# Altium footprint library PCBLIB.PcbLib: 103 footprints (part 5 of 7)
Each footprint in its own frame and in the unit in brackets; x right, y up, seen from the top. Pads: shape width x height; smd on the part's side, far side on the other; paste and mask are expansions set on the pad; w line width, h text height; cw(c..) or ccw(c..) is an arc to the next point about the centre after c.
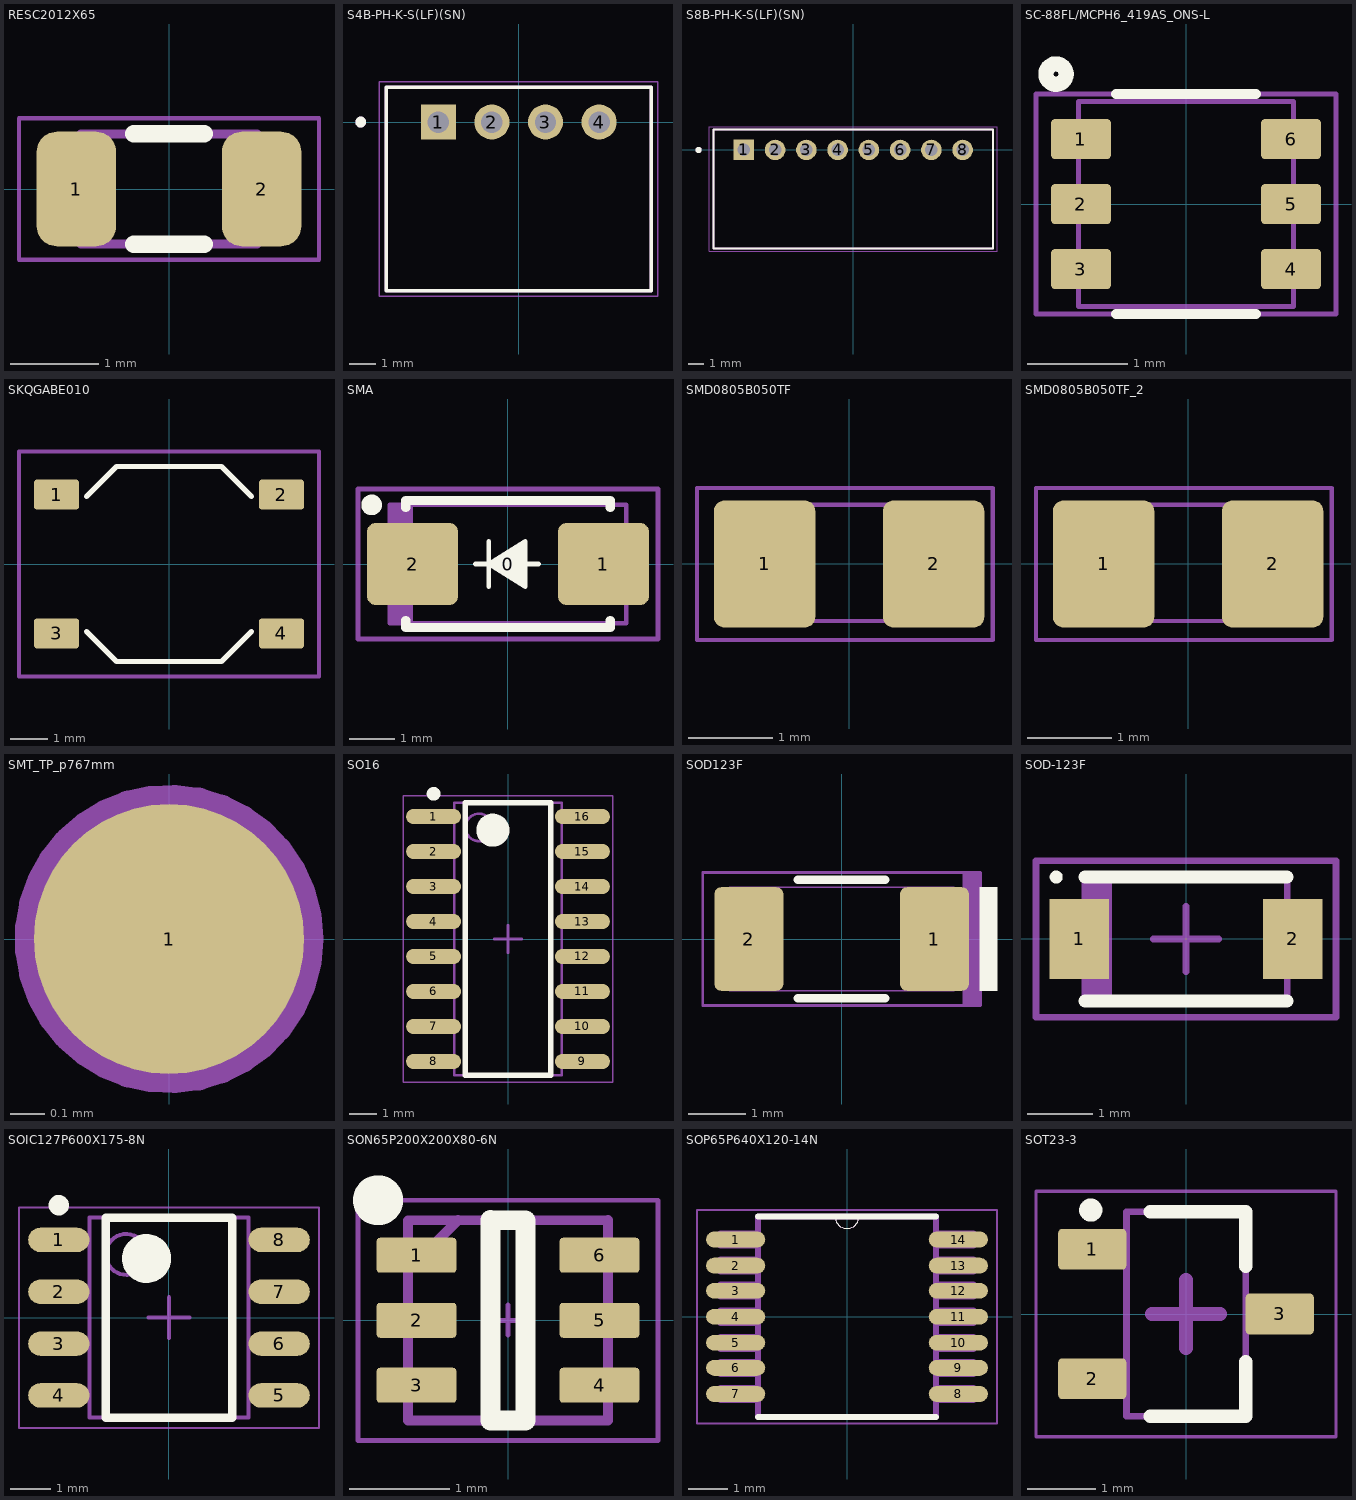
[diagram p4: the footprints below, top view; thin cyan lines are the x and y axes]

## RESC2012X65 [mm]
pads (2):
  rrect50% 0.9x1.3 smd paste+0 mask+0.05: 1(-1.05,0) 2(1.05,0)
Top Overlay:
  lines w0.2: -0.4,-0.625 0.4,-0.625 ; -0.4,0.625 0.4,0.625
Top Component Outline:
  lines w0.05: -1.7,-0.8 1.7,-0.8 1.7,0.8 -1.7,0.8 -1.7,-0.8
Top Assembly:
  region: 0.7,-0.625 0.7,0.625 1,0.625 1,-0.625
  region: -1,-0.625 -1,0.625 -0.7,0.625 -0.7,-0.625
  lines w0.1: -0.7,-0.525 -0.7,0.525 ; 0.7,-0.525 0.7,0.525 ; -0.7,-0.625 0.7,-0.625 ; -0.7,-0.625 -0.7,0.625 ; -0.7,-0.625 -0.72,-0.625 -0.74,-0.625 -1,-0.625 -1,0.625 -0.74,0.625 -0.72,0.625 -0.7,0.625 ; -0.7,0.625 0.7,0.625 ; 0.7,-0.625 0.7,0.625 ; 0.7,-0.625 0.72,-0.625 0.74,-0.625 1,-0.625 1,0.625 0.74,0.625 0.72,0.625 0.7,0.625
Top Designator:
  text ".Designator" at 1.578,0.158 h0.7
Bottom Designator:
  text ".Comment" at -0.506,-0.2 h0.64
Mechanical 11:
  text ".Designator" at -0.506,-0.2 h0.64
3D body "RES0805.step": height 0.5, standoff 0, extent -1,-0.625 1,0.625

## S4B-PH-K-S(LF)(SN) [mm]
pads (4):
  rect 1.308x1.308 / inner round 1.308 / far side rect 1.308x1.308 hole 0.8: 1(-3,0)
  round 1.308 hole 0.8: 2(-1,0) 3(1,0) 4(3,0)
Top Overlay:
  circle w0.2: c-5.9,0 r0.1
  lines w0.127: -4.95,-6.3 4.95,-6.3 4.95,1.3 -4.95,1.3 -4.95,-6.3
Bottom Courtyard:
  circle w0.2: c-5.9,0 r0.1
  lines w0.127: -4.95,-6.3 -4.95,1.3 4.95,1.3 4.95,-6.3 -4.95,-6.3
Bottom 3D Body:
  lines w0.05: -5.2,-6.5 5.2,-6.5 5.2,1.5 -5.2,1.5 -5.2,-6.5
3D body "JST-S4B-PH-K-S.STEP": height 4.8, standoff -3.4, extent -4.95,-6.3 4.95,1.3

## S8B-PH-K-S(LF)(SN) [mm]
pads (8):
  rect 1.308x1.308 / inner round 1.308 / far side rect 1.308x1.308 hole 0.8: 1(-7,0)
  round 1.308 hole 0.8: 2(-5,0) 3(-3,0) 4(-1,0) 5(1,0) 6(3,0) 7(5,0) 8(7,0)
Top Overlay:
  circle w0.2: c-9.9,0 r0.1
  lines w0.127: -8.95,-6.3 -8.95,1.3 8.95,1.3 8.95,-6.3 -8.95,-6.3
Bottom Courtyard:
  circle w0.2: c-9.9,0 r0.1
  lines w0.127: -8.95,-6.3 8.95,-6.3 8.95,1.3 -8.95,1.3 -8.95,-6.3
Bottom 3D Body:
  lines w0.05: -9.2,-6.5 -9.2,1.5 9.2,1.5 9.2,-6.5 -9.2,-6.5
3D body "JST-S8B-PH-K-S.STEP": height 4.8, standoff -3.4, extent -8.95,-6.3 8.95,1.3

## SC-88FL/MCPH6_419AS_ONS-L [mm]
pads (6):
  rrect20% 0.6x0.4 smd paste+0 mask+0.05: 1(-1.05,0.65) 2(-1.05,0) 3(-1.05,-0.65) 4(1.05,-0.65) 5(1.05,0) 6(1.05,0.65)
Top Overlay:
  circle w0.152: c-1.3,1.3 r0.102
  lines w0.1: -0.7,-1.1 0.7,-1.1 ; -0.7,1.1 0.7,1.1
Top Component Outline:
  lines w0.05: -1.5,-1.1 1.5,-1.1 1.5,1.1 -1.5,1.1 -1.5,-1.1
Top Assembly:
  lines w0.05: -1.075,-1.025 1.075,-1.025 1.075,1.025 -1.075,1.025 -1.075,-1.025
Top Designator:
  text ".Designator" at -0.915,-0.115 h0.4
3D body "SC-88FLMCPH6_419AS_ONS.step": height 0.89, standoff 0, extent -1.08,-1.029 1.08,1.029

## SKQGABE010 [mm]
pads (4):
  rrect20% 1.2x0.8 smd mask+0.102: 1(-3,1.85) 2(3,1.85) 3(-3,-1.85) 4(3,-1.85)
Top Overlay:
  lines w0.127: -2.2,-1.8 -1.4,-2.6 1.4,-2.6 2.2,-1.8 ; -2.2,1.8 -1.4,2.6 1.4,2.6 2.2,1.8
Top Component Outline:
  lines w0.1: -4,-3 -4,3 4,3 4,-3 -4,-3
3D body "skqgabe010.stp": height 1.5, standoff 0, extent -3.2,-2.6 3.2,2.6

## SMA [mm]
pads (3):
  round 0.508 on Mech7 mask+0.07: 0(0,0)
  rrect20% 2x1.8 smd mask+0.07: 1(2.1,0) 2(-2.1,0)
Top Overlay:
  circle w0.254: c-3,1.3 r0.1
  region: 0.375,-0.5 0.375,0.5 -0.425,0
  lines w0.1: -0.725,0 -0.425,0 ; -0.425,-0.5 -0.425,0 ; -0.425,0.5 -0.425,0 ; 0.375,0 0.675,0 ; -0.425,0 0.375,-0.5 0.375,0.5 -0.425,0
  lines w0.2: -2.25,-1.24 -2.25,-1.4 2.25,-1.4 2.25,-1.24 ; -2.25,1.24 -2.25,1.4 2.25,1.4 2.25,1.24
Top Component Outline:
  lines w0.1: -3.3,-1.65 3.3,-1.65 3.3,1.65 -3.3,1.65 -3.3,-1.65
Top Assembly:
  region: -2.6,1.3 -2.1,1.3 -2.1,-1.3 -2.6,-1.3
  lines w0.1: -2.6,-1.3 -2.6,1.3 2.6,1.3 2.6,-1.3 -2.6,-1.3
Top Designator:
  text ".Value" at 1.019,0.249 h0.8
3D body "SW3dPS-DO-214AC SMA.STEP": height 2.42, standoff 0.02, extent -2.6,-1.3 2.6,1.3

## SMD0805B050TF [mm] "PPTC SMD 0805, 6V 0.5A, REEL 7\""
height 0.6
pads (2):
  rrect20% 1.2x1.5 smd paste+0 mask+0.05: 1(-1,0) 2(1,0)
Top Component Outline:
  lines w0.05: -1.8,-0.9 1.7,-0.9 1.7,0.9 -1.8,0.9 -1.8,-0.9
Top Assembly:
  lines w0.05: -1.2,-0.675 -1.2,0.7 1.075,0.7 1.075,-0.675 -1.2,-0.675
Top Designator:
  text ".Designator" at 0.897,0.09 h0.4
Bottom Designator:
  text ".Designator" at -1.025,0 h0.5
3D body "User Library-Part1-227.STEP": height 0.86, standoff -0.01, extent -1.15,-0.75 1.15,0.75

## SMD0805B050TF_2 [mm]
pads (2):
  rrect20% 1.2x1.5 smd paste+0 mask+0.05: 1(-1,0) 2(1,0)
Top Component Outline:
  lines w0.05: -1.8,-0.9 -1.8,0.9 1.7,0.9 1.7,-0.9 -1.8,-0.9
Top Assembly:
  lines w0.05: -1.2,-0.675 1.075,-0.675 1.075,0.7 -1.2,0.7 -1.2,-0.675
Top Designator:
  text ".Designator" at 0.897,0.09 h0.4
Bottom Designator:
  text ".Designator" at -1.025,0 h0.5
3D body "User Library-Part1-227.STEP": height 0.86, standoff -0.01, extent -1.15,-0.75 1.15,0.75

## SMT_TP_p767mm [mm] "Test Point"
pads (1):
  round 0.787 smd paste-5 mask+0.05: 1(0,0)
Top Component Center:
  circle w0.015: c0,0 r0.416
  lines w0.05: -0.2,0 0.2,0 ; 0,-0.2 0,0.2
Bottom Component Center:
  circle w0.1: c0,0 r0.4
Top Assembly:
  text ".Designator" at -0.897,-0.09 h0.4
Mechanical 17:
  circle w0.015: c0,0 r0.437
3D body: height 0.05, standoff 0, extent -0.425,-0.425 0.422,0.425

## SO16 [mm] "SOIC, 16-Leads, Body 9.90x3.91mm, Pitch 1.27mm, IPC Medium Density"
height 1.75
pads (16):
  oval 2x0.55 smd: 1(-2.7,4.445) 2(-2.7,3.175) 3(-2.7,1.905) 4(-2.7,0.635) 5(-2.7,-0.635) 6(-2.7,-1.905) 7(-2.7,-3.175) 8(-2.7,-4.445) 9(2.7,-4.445) 10(2.7,-3.175) 11(2.7,-1.905) 12(2.7,-0.635) 13(2.7,0.635) 14(2.7,1.905) 15(2.7,3.175) 16(2.7,4.445)
Top Overlay:
  circle w0.6: c-0.55,3.95 r0.3
  circle w0.25: c-2.7,5.27 r0.125
  lines w0.2: -1.55,-4.95 1.55,-4.95 1.55,4.95 -1.55,4.95 -1.55,-4.95
Top Component Outline:
  lines w0.05: -3.81,-5.2 3.81,-5.2 3.81,5.2 -3.81,5.2 -3.81,-5.2
Bottom Courtyard:
  circle w0.1: c-1.05,4.05 r0.5
  lines w0.1: -1.95,-4.95 1.95,-4.95 1.95,4.95 -1.95,4.95 -1.95,-4.95
Bottom 3D Body:
  lines w0.1: -0.5,0 0.5,0 ; 0,-0.5 0,0.5
3D body "User Library-SOIC-16-1.step": height 1.4, standoff 0, extent -3,-4.95 3,4.95

## SOD123F [mm]
pads (2):
  rrect20% 1.2x1.8 smd paste+0 mask+0.05: 1(1.613,0) 2(-1.613,0)
Top Overlay:
  region: 2.4,0.9 2.4,-0.9 2.7,-0.9 2.7,0.9
  lines w0.152: -0.759,-1.029 0.759,-1.029 ; -0.759,1.029 0.759,1.029
Top Component Outline:
  lines w0.05: -2.413,-1.156 -2.413,1.156 2.413,1.156 2.413,-1.156 -2.413,-1.156
Bottom Courtyard:
  lines w0.025: -1.549,-0.451 -1.099,-0.902 ; -1.549,0.451 -1.099,0.902 ; -1.549,-0.902 -1.549,0.902 ; -1.549,-0.902 1.549,-0.902 ; -1.549,-0.902 -1.956,-0.902 -1.956,0.902 -1.549,0.902 ; -1.549,-0.902 -1.549,0.902 ; -1.549,0.902 1.549,0.902 ; 1.549,-0.902 1.549,0.902 ; 1.549,-0.902 1.956,-0.902 1.956,0.902 1.549,0.902 ; 1.549,-0.902 1.549,0.902
Bottom 3D Body:
  region: 2.413,1.156 2.108,1.156 2.108,-1.156 2.413,-1.156
3D body "CDBM.step": height 0.82, standoff 0, extent -1.956,-0.902 1.956,0.902

## SOD-123F [mm] "Molded Diode, 2-Leads, Body 2.83x1.65mm, IPC Medium Density"
height 1.35
pads (2):
  rect 0.91x1.22 smd mask+0.07: 1(-1.635,0) 2(1.635,0)
Top Overlay:
  circle w0.1: c-1.99,0.95 r0.05
  lines w0.2: -1.55,-0.95 1.55,-0.95 ; -1.55,0.95 1.55,0.95
Top Component Outline:
  lines w0.1: -0.5,0 0.5,0 ; 0,-0.5 0,0.5 ; -2.3,-1.2 -2.3,1.2 2.3,1.2 2.3,-1.2 -2.3,-1.2
Top Assembly:
  rectangle: -1.55,-0.95 -1.133,0.95
  lines w0.1: -1.55,-0.95 -1.55,0.95 1.55,0.95 1.55,-0.95 -1.55,-0.95
Top Designator:
  text ".Value" at -1.019,-0.249 h0.8
3D body "User Library-SOD123F.STEP": height 1.2, standoff -0.01, extent -1.875,-0.875 1.875,0.825

## SOIC127P600X175-8N [mm]
pads (8):
  oval 1.5x0.6 smd mask+0.05: 1(-2.7,1.905) 2(-2.7,0.635) 3(-2.7,-0.635) 4(-2.7,-1.905) 5(2.7,-1.905) 6(2.7,-0.635) 7(2.7,0.635) 8(2.7,1.905)
Top Overlay:
  circle w0.6: c-0.55,1.45 r0.3
  circle w0.25: c-2.7,2.755 r0.125
  lines w0.2: -1.55,-2.45 1.55,-2.45 1.55,2.45 -1.55,2.45 -1.55,-2.45
Top Component Outline:
  lines w0.05: -3.675,-2.7 -3.675,2.7 3.675,2.7 3.675,-2.7 -3.675,-2.7
Top Assembly:
  lines w0.1: -1.95,-2.45 1.95,-2.45 1.95,2.45 -1.95,2.45 -1.95,-2.45
Bottom Courtyard:
  circle w0.1: c-1.05,1.55 r0.5
Bottom 3D Body:
  lines w0.1: -0.5,0 0.5,0 ; 0,-0.5 0,0.5
3D body "TPS5430DDAR.stp": height 1.57, standoff 0, extent -3.014,-2.45 3.014,2.45

## SON65P200X200X80-6N [mm]
pads (6):
  rrect20% 0.8x0.35 smd mask+0.05: 1(-0.915,0.65) 2(-0.915,0) 3(-0.915,-0.65) 4(0.915,-0.65) 5(0.915,0) 6(0.915,0.65)
Top Overlay:
  circle w0.25: c-1.3,1.2 r0.125
  lines w0.2: -0.175,-1 0.175,-1 0.175,1 -0.175,1 -0.175,-1
Top Component Center:
  lines w0.05: -0.15,0 0.15,0 ; 0,-0.15 0,0.15
Top Component Outline:
  lines w0.05: -1.5,-1.2 1.5,-1.2 1.5,1.2 -1.5,1.2 -1.5,-1.2
Top Assembly:
  lines w0.1: -1,0.5 -0.5,1 ; -1,-1 1,-1 ; -1,-1 -1,1 ; -1,-1 -1,1 ; -1,-1 1,-1 ; -1,1 1,1 ; -1,1 1,1 ; 1,-1 1,1 ; 1,-1 1,1
  text ".Designator" at -1.578,-0.158 h0.7
3D body "MAX17225ELT+.stp": height 0.8, standoff 0, extent -1.05,-1 1.05,1

## SOP65P640X120-14N [mm]
pads (14):
  oval 1.5x0.4 smd mask+0.05: 1(-2.819,1.956) 2(-2.819,1.295) 3(-2.819,0.66) 4(-2.819,0) 5(-2.819,-0.66) 6(-2.819,-1.295) 7(-2.819,-1.956) 8(2.819,-1.956) 9(2.819,-1.295) 10(2.819,-0.66) 11(2.819,0) 12(2.819,0.66) 13(2.819,1.295) 14(2.819,1.956)
Top Overlay:
  lines w0: -0.305,2.54 ccw(c0,2.54) 0.305,2.54
  lines w0.152: -2.261,-2.54 2.261,-2.54 ; -2.261,2.54 -0.305,2.54 0.305,2.54 2.261,2.54
Top Component Outline:
  lines w0.05: -3.8,-2.7 -3.8,2.7 3.8,2.7 3.8,-2.7 -3.8,-2.7
Bottom Courtyard:
  lines w0: -0.305,2.54 ccw(c0,2.54) 0.305,2.54
  lines w0.152: -3.2,-2.108 -3.2,-1.803 -2.261,-1.803 -2.261,-2.108 -3.2,-2.108 ; -3.2,-1.448 -3.2,-1.143 -2.261,-1.143 -2.261,-1.448 -3.2,-1.448 ; -3.2,-0.813 -3.2,-0.508 -2.261,-0.508 -2.261,-0.813 -3.2,-0.813 ; -3.2,-0.152 -3.2,0.152 -2.261,0.152 -2.261,-0.152 -3.2,-0.152 ; -3.2,0.508 -3.2,0.813 -2.261,0.813 -2.261,0.508 -3.2,0.508 ; -3.2,1.143 -3.2,1.448 -2.261,1.448 -2.261,1.143 -3.2,1.143 ; -3.2,1.803 -3.2,2.108 -2.261,2.108 -2.261,1.803 -3.2,1.803 ; -2.261,-2.54 2.261,-2.54 2.261,2.54 0.305,2.54 -0.305,2.54 -2.261,2.54 -2.261,-2.54 ; 2.261,-2.108 2.261,-1.803 3.2,-1.803 3.2,-2.108 2.261,-2.108 ; 2.261,-1.448 2.261,-1.143 3.2,-1.143 3.2,-1.448 2.261,-1.448 ; 2.261,-0.813 2.261,-0.508 3.2,-0.508 3.2,-0.813 2.261,-0.813 ; 2.261,-0.152 2.261,0.152 3.2,0.152 3.2,-0.152 2.261,-0.152 ; 2.261,0.508 2.261,0.813 3.2,0.813 3.2,0.508 2.261,0.508 ; 2.261,1.143 2.261,1.448 3.2,1.448 3.2,1.143 2.261,1.143 ; 2.261,1.803 2.261,2.108 3.2,2.108 3.2,1.803 2.261,1.803
3D body "TSSOP-14 0.65p 4.4mm.step": height 1, standoff 0, extent -3.15,-2.5 3.15,2.5

## SOT23-3 [mm]
pads (3):
  rrect20% 1x0.6 smd: 1(-1.375,0.95) 2(-1.375,-0.95) 3(1.375,0)
Top Overlay:
  circle w0.2: c-1.397,1.524 r0.07
  lines w0.2: -0.525,-1.5 0.875,-1.5 0.875,-0.7 ; -0.525,1.5 0.875,1.5 0.875,0.7
Top Component Outline:
  lines w0.05: -2.2,-1.8 2.2,-1.8 2.2,1.8 -2.2,1.8 -2.2,-1.8
Bottom Courtyard:
  lines w0.1: -0.875,-1.5 -0.875,1.5 0.875,1.5 0.875,-1.5 -0.875,-1.5
Bottom 3D Body:
  lines w0.2: -0.5,0 0.5,0 ; 0,-0.5 0,0.5
3D body "SW3DPS-SOT-23-DEFAULT.STEP": height 1.06, standoff -0.04, extent -1.25,-1.5 1.25,1.5